# Altium footprint library YQPOWER.PcbLib: 215 footprints (part 13 of 14)
Each footprint in its own frame and in the unit in brackets; x right, y up, seen from the top. Pads: shape width x height; smd on the part's side, far side on the other; paste and mask are expansions set on the pad; w line width, h text height; cw(c..) or ccw(c..) is an arc to the next point about the centre after c.
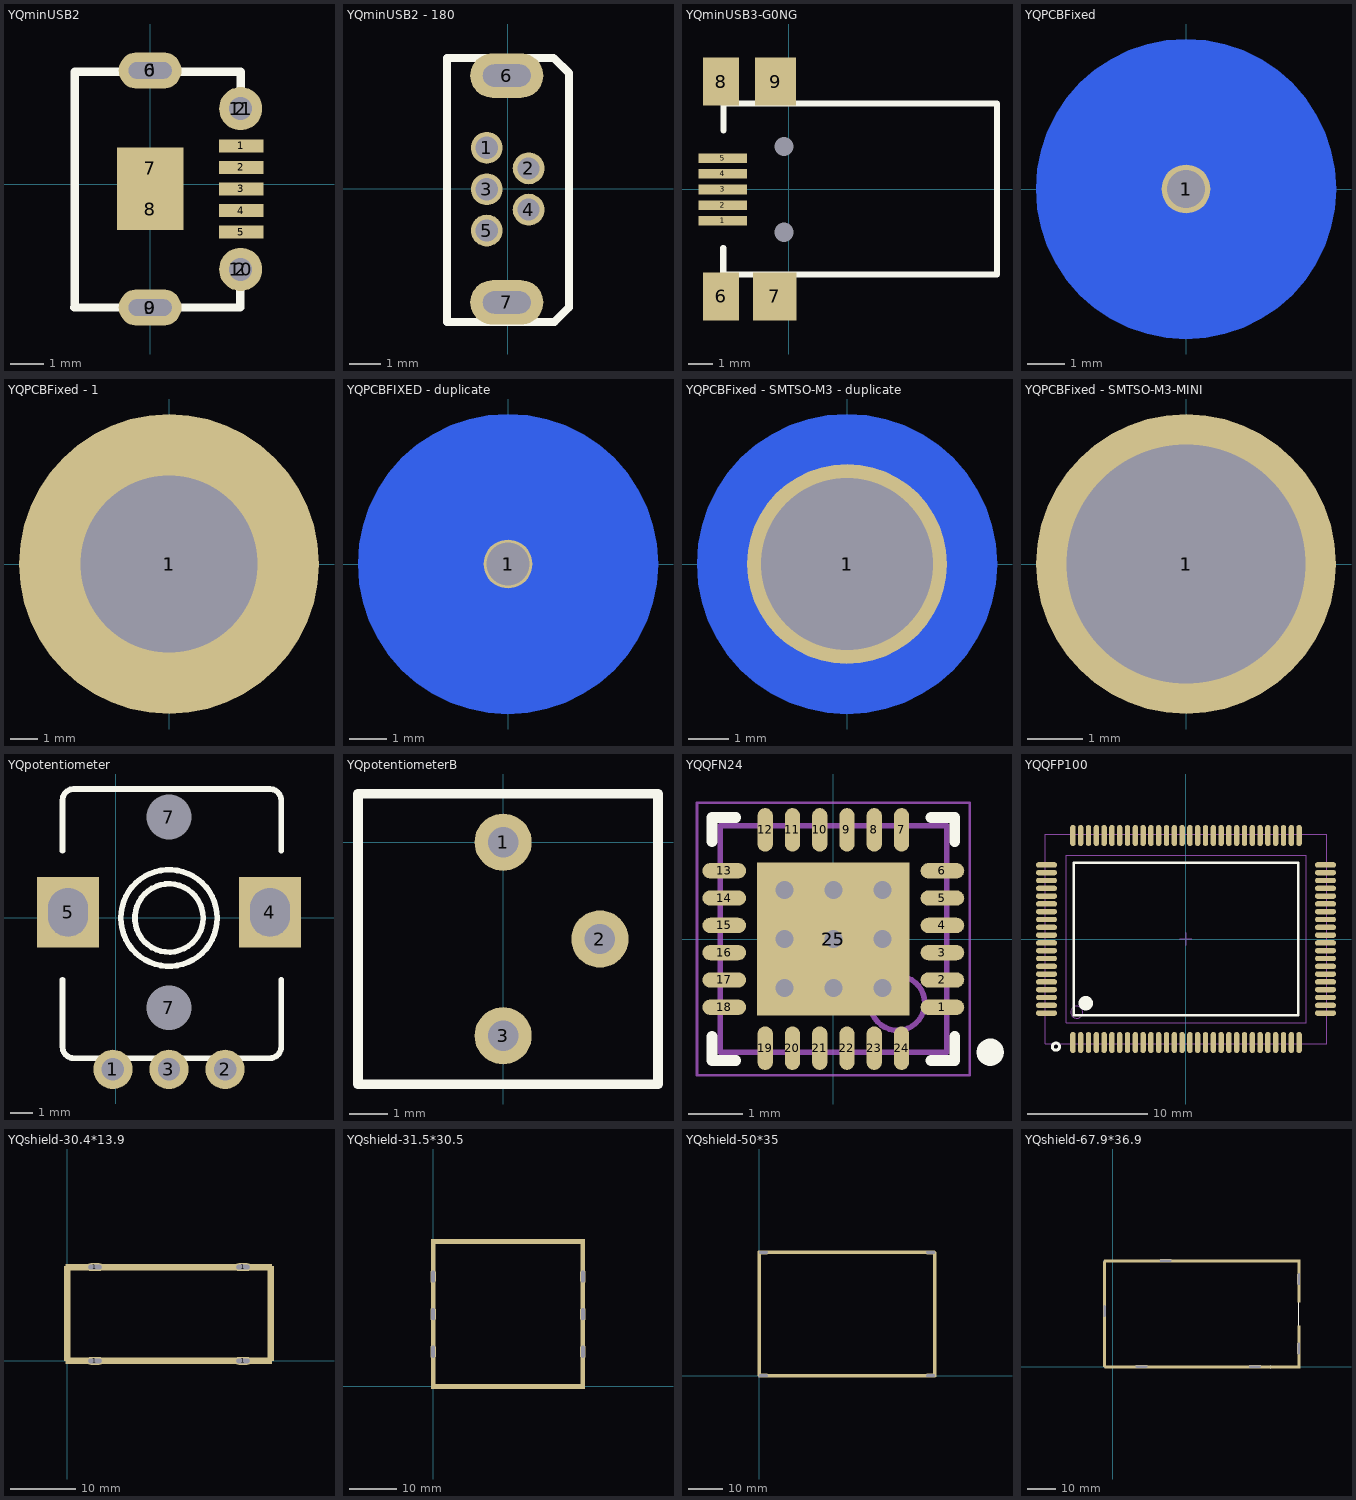
[diagram p12: the footprints below, top view; thin cyan lines are the x and y axes]

## YQminUSB2 [mm] "无卷边"
pads (15):
  oval 1.9x1.1 on Top Paste: 0(0,-3.721) 0(0,3.429)
  rect 1.35x0.4 smd: 1(2.75,1.154) 2(2.75,0.504) 3(2.75,-0.146) 4(2.75,-0.796) 5(2.75,-1.446)
  round 1.3 on Top Paste: 2(2.73,-2.571) 2(2.73,2.279)
  oval 1.9x1.1 hole 0.5 slot 1.3 at 0 deg: 6(0,3.429)
  rect 2x1.25 smd: 7(0,0.479) 8(0,-0.762)
  oval 1.9x1.1 hole 0.5 slot 1.3 at 0 deg paste-2539.97: 9(0,-3.721)
  round 1.3 hole 0.7: 10(2.73,-2.571) 11(2.73,2.279)
Top Overlay:
  lines w0.254: 2.73,-2.571 2.714,-2.587 2.714,-3.721 -2.286,-3.721 -2.27,-3.705 -2.27,3.391 2.73,3.391 2.73,2.279

## YQminUSB2 - 180 [mm] "无卷边"
pads (7):
  round 1 hole 0.7: 1(-0.654,1.281) 2(0.66,0.635) 3(-0.654,-0.019) 4(0.66,-0.66) 5(-0.654,-1.319)
  oval 2.3x1.4 hole 0.7 slot 1.5 at 0 deg: 6(-0.025,3.556)
  oval 2.3x1.4 hole 0.7 slot 1.5 at 0 deg paste-2539.97: 7(-0.025,-3.581)
Top Overlay:
  lines w0.254: -1.905,-4.191 1.473,-4.191 1.93,-3.734 1.93,2.845 1.93,3.632 1.448,4.115 -1.905,4.115 -1.905,-4.191

## YQminUSB3-G0NG [mm] "无卷边"
pads (11):
  rect 2x0.4 smd: 1(-2.75,-1.306) 2(-2.75,-0.656) 3(-2.75,-0.006) 4(-2.75,0.644) 5(-2.75,1.294)
  rect 1.5x2 smd: 6(-2.819,-4.445) 8(-2.819,4.47)
  rect 1.8x2 smd: 7(-0.584,-4.445)
  rect 1.7x2 smd: 9(-0.559,4.47)
  round 0 hole 0.8: 10(-0.203,1.778) 11(-0.203,-1.778)
Top Overlay:
  lines w0.254: -2.73,-2.431 -2.73,-3.543 8.636,-3.543 8.636,3.569 -2.714,3.569 -2.714,2.435

## YQPCBFixed [mm] "3mm"
height 20
pads (2):
  round 1.3 hole 1: 1(0,0)
  round 8 smd far side: 1(0,0)

## YQPCBFixed - 1 [mm] "5mm high,5mm D,1mm hole"
pads (2):
  round 7 hole 6.5: 1(0,0)
  round 11 smd: 1(0,0)

## YQPCBFIXED - duplicate [mm] "3mm"
height 20
pads (2):
  round 1.3 hole 1.15: 1(0,0)
  round 8 smd far side: 1(0,0)

## YQPCBFixed - SMTSO-M3 - duplicate [mm] "3mm"
height 20
pads (2):
  round 5 hole 4.3: 1(0,0)
  round 7.5 smd far side: 1(0,0)

## YQPCBFixed - SMTSO-M3-MINI [mm] "3mm"
height 20
pads (2):
  round 5 hole 4.3: 1(0,0)
  round 5.4 smd: 1(0,0)

## YQpotentiometer [mil]
height 82.68
pads (7):
  round 70 hole 40: 1(-5,-270) 2(195,-270) 3(95,-270)
  rect 110.24x125.98 hole 70.87 slot 86.61 at 90 deg: 4(275,10) 5(-85,10)
  round 60 hole 80: 7(95,-160) 7(95,180)
Top Overlay:
  circle w10: c95,0 r86.02
  circle w10: c95,0 r60.83
  lines w10: -95,-110 -95,-230 ccw(c-75,-230) -75,-250 275,-250 ccw(c275,-230) 295,-230 295,-110 ; -95,120 -95,210 cw(c-75,210) -75,230 275,230 cw(c275,210) 295,210 295,120

## YQpotentiometerB [mm]
height 2.7
pads (3):
  round 1.5 hole 0.8: 1(0,0) 2(2.54,-2.54) 3(0,-5.08)
Top Overlay:
  lines w0.254: -3.81,-6.35 -3.81,1.27 4.064,1.27 4.064,-6.35 -3.81,-6.35

## YQQFN24 [mm]
height 1
pads (25):
  oval 0.8x0.28 smd paste-0.025 mask+0.07: 1(2,-1.25) 2(2,-0.75) 3(2,-0.25) 4(2,0.25) 5(2,0.75) 6(2,1.25) 13(-2,1.25) 14(-2,0.75) 15(-2,0.25) 16(-2,-0.25) 17(-2,-0.75) 18(-2,-1.25)
  oval 0.28x0.8 smd paste-0.025 mask+0.07: 7(1.25,2) 8(0.75,2) 9(0.25,2) 10(-0.25,2) 11(-0.75,2) 12(-1.25,2) 19(-1.25,-2) 20(-0.75,-2) 21(-0.25,-2) 22(0.25,-2) 23(0.75,-2) 24(1.25,-2)
  rect 2.8x2.8 smd paste-1.4 mask+0.07: 25(0,0)
via -0.9,0.9 diameter 0.635 hole 0.33
via 0,0.9 diameter 0.635 hole 0.33
via 0.9,0.9 diameter 0.635 hole 0.33
via -0.9,0 diameter 0.635 hole 0.33
via 0,0 diameter 0.635 hole 0.33
via 0.9,0 diameter 0.635 hole 0.33
via -0.9,-0.9 diameter 0.635 hole 0.33
via 0,-0.9 diameter 0.635 hole 0.33
via 0.9,-0.9 diameter 0.635 hole 0.33
Top Overlay:
  circle w0.25: c2.875,-2.075 r0.125
  lines w0.2: -2.225,-1.79 -2.225,-2.225 -1.79,-2.225 ; -2.225,1.79 -2.225,2.225 -1.79,2.225 ; 1.79,-2.225 2.225,-2.225 2.225,-1.79 ; 1.79,2.225 2.225,2.225 2.225,1.79
Top Paste:
  region: -0.15,-0.15 -1.25,-0.15 -1.25,-1.25 -0.15,-1.25
  rectangle: 0.15,-1.25 1.25,-0.15
  rectangle: 0.15,0.15 1.25,1.25
  region: -0.15,1.25 -1.25,1.25 -1.25,0.15 -0.15,0.15
Mechanical 5:
  circle w0.1: c1.175,-1.175 r0.5
  lines w0.1: -2.075,-2.075 2.075,-2.075 2.075,2.075 -2.075,2.075 -2.075,-2.075
  text ".Designator" at -1.27,1.778 h1.02
Mechanical 15:
  lines w0.05: -2.5,-2.5 2.5,-2.5 2.5,2.5 -2.5,2.5 -2.5,-2.5
  lines w0.1: -0.5,0 0.5,0 ; 0,-0.5 0,0.5
3D body: height 1, standoff 0, extent -2.075,-2.075 2.075,2.075

## YQQFP100 [mm] "100pin"
pads (100):
  oval 0.45x1.75 smd: 1(-9.425,-8.625) 2(-8.775,-8.625) 3(-8.125,-8.625) 4(-7.475,-8.625) 5(-6.825,-8.625) 6(-6.175,-8.625) 7(-5.525,-8.625) 8(-4.875,-8.625) 9(-4.225,-8.625) 10(-3.575,-8.625) 11(-2.925,-8.625) 12(-2.275,-8.625) 13(-1.625,-8.625) 14(-0.975,-8.625) 15(-0.325,-8.625) 16(0.325,-8.625) 17(0.975,-8.625) 18(1.625,-8.625) 19(2.275,-8.625) 20(2.925,-8.625) 21(3.575,-8.625) 22(4.225,-8.625) 23(4.875,-8.625) 24(5.525,-8.625) 25(6.175,-8.625) 26(6.825,-8.625) 27(7.475,-8.625) 28(8.125,-8.625) 29(8.775,-8.625) 30(9.425,-8.625) 51(9.425,8.625) 52(8.775,8.625) 53(8.125,8.625) 54(7.475,8.625) 55(6.825,8.625) 56(6.175,8.625) 57(5.525,8.625) 58(4.875,8.625) 59(4.225,8.625) 60(3.575,8.625) 61(2.925,8.625) 62(2.275,8.625) 63(1.625,8.625) 64(0.975,8.625) 65(0.325,8.625) 66(-0.325,8.625) 67(-0.975,8.625) 68(-1.625,8.625) 69(-2.275,8.625) 70(-2.925,8.625) 71(-3.575,8.625) 72(-4.225,8.625) 73(-4.875,8.625) 74(-5.525,8.625) 75(-6.175,8.625) 76(-6.825,8.625) 77(-7.475,8.625) 78(-8.125,8.625) 79(-8.775,8.625) 80(-9.425,8.625)
  oval 1.75x0.45 smd: 31(11.625,-6.175) 32(11.625,-5.525) 33(11.625,-4.875) 34(11.625,-4.225) 35(11.625,-3.575) 36(11.625,-2.925) 37(11.625,-2.275) 38(11.625,-1.625) 39(11.625,-0.975) 40(11.625,-0.325) 41(11.625,0.325) 42(11.625,0.975) 43(11.625,1.625) 44(11.625,2.275) 45(11.625,2.925) 46(11.625,3.575) 47(11.625,4.225) 48(11.625,4.875) 49(11.625,5.525) 50(11.625,6.175) 81(-11.625,6.175) 82(-11.625,5.525) 83(-11.625,4.875) 84(-11.625,4.225) 85(-11.625,3.575) 86(-11.625,2.925) 87(-11.625,2.275) 88(-11.625,1.625) 89(-11.625,0.975) 90(-11.625,0.325) 91(-11.625,-0.325) 92(-11.625,-0.975) 93(-11.625,-1.625) 94(-11.625,-2.275) 95(-11.625,-2.925) 96(-11.625,-3.575) 97(-11.625,-4.225) 98(-11.625,-4.875) 99(-11.625,-5.525) 100(-11.625,-6.175)
Top Overlay:
  circle w0.25: c-10.838,-8.969 r0.3
  circle w0.6: c-8.35,-5.35 r0.3
  lines w0.2: -9.35,-6.35 9.35,-6.35 9.35,6.35 -9.35,6.35 -9.35,-6.35
Mechanical 13:
  circle w0.1: c-9.1,-6.1 r0.5
  lines w0.1: -10,-7 10,-7 10,7 -10,7 -10,-7
Mechanical 15:
  lines w0.1: -0.5,0 0.5,0 ; 0,-0.5 0,0.5 ; -11.75,-8.75 11.75,-8.75 11.75,8.75 -11.75,8.75 -11.75,-8.75
3D body: height 1.6, standoff 0, extent -10,-7 10,7

## YQshield-30.4*13.9 [mm]
pads (8):
  rect 1x14.5 smd: 1(0,7.239) 1(31,7.239)
  oval 2.5x1.2 hole 0.7 slot 2 at 0 deg: 1(4.2,0) 1(4.2,14.3) 1(26.8,0) 1(26.8,14.3)
  rect 31.5x1 smd: 1(15.442,0) 1(15.442,14.3)
Top Overlay:
  lines w0.254: 0,0 0,14.3 31,14.3 31,0 0,0

## YQshield-31.5*30.5 [mm]
pads (10):
  oval 1.2x3 hole 0.7 slot 2.5 at 90 deg: 1(0,7.4) 1(0,15.4) 1(0,23.4) 1(31.9,7.4) 1(31.9,15.4) 1(31.9,23.4)
  rect 1x32 smd: 1(0,15.45) 1(31.9,15.45)
  rect 32.8x1 smd: 1(15.95,0) 1(15.979,30.861)
Top Overlay:
  lines w0.254: 0,0 31.9,0 31.9,30.9 0,30.9 0,0

## YQshield-50*35 [mm]
pads (8):
  rect 1x36 smd: 1(0,17.907) 1(50.546,17.653)
  oval 3x1.2 hole 0.7 slot 2.5 at 0 deg: 1(1.143,0) 1(1.143,35.56) 1(49.403,0) 1(49.403,35.56)
  rect 51x1 smd: 1(25.146,35.56) 1(25.273,0)
Top Overlay:
  lines w0.254: 0,35.5 0,0 50.5,0 ; 50.546,0 50.546,35.5 ; 0,35.56 50.5,35.56 0,35.56

## YQshield-67.9*36.9 [mm]
pads (11):
  rect 1x37 smd: 1(-2.794,18.288)
  oval 1.2x4.5 hole 0.7 slot 4 at 90 deg: 1(-2.794,19.431) 1(65.278,6.35) 1(65.278,30.607)
  oval 4.5x1.2 hole 0.7 slot 4 at 0 deg: 1(10.15,0) 1(18.624,37.084) 1(49.9,0)
  rect 68x1 smd: 1(30.988,36.957) 1(31.115,-0.127)
  rect 1x15 smd: 1(65.278,6.858) 1(65.278,29.972)
Top Overlay:
  lines w0.254: 55.499,-0.508 55.499,0.254 ; -2.921,0 65.2,0 65.2,37.084 -2.921,37.084 -2.921,0